# Altium footprint library AltiumDesignerLibraries.PcbLib: 313 footprints (part 15 of 20)
Each footprint in its own frame and in the unit in brackets; x right, y up, seen from the top. Pads: shape width x height; smd on the part's side, far side on the other; paste and mask are expansions set on the pad; w line width, h text height; cw(c..) or ccw(c..) is an arc to the next point about the centre after c.
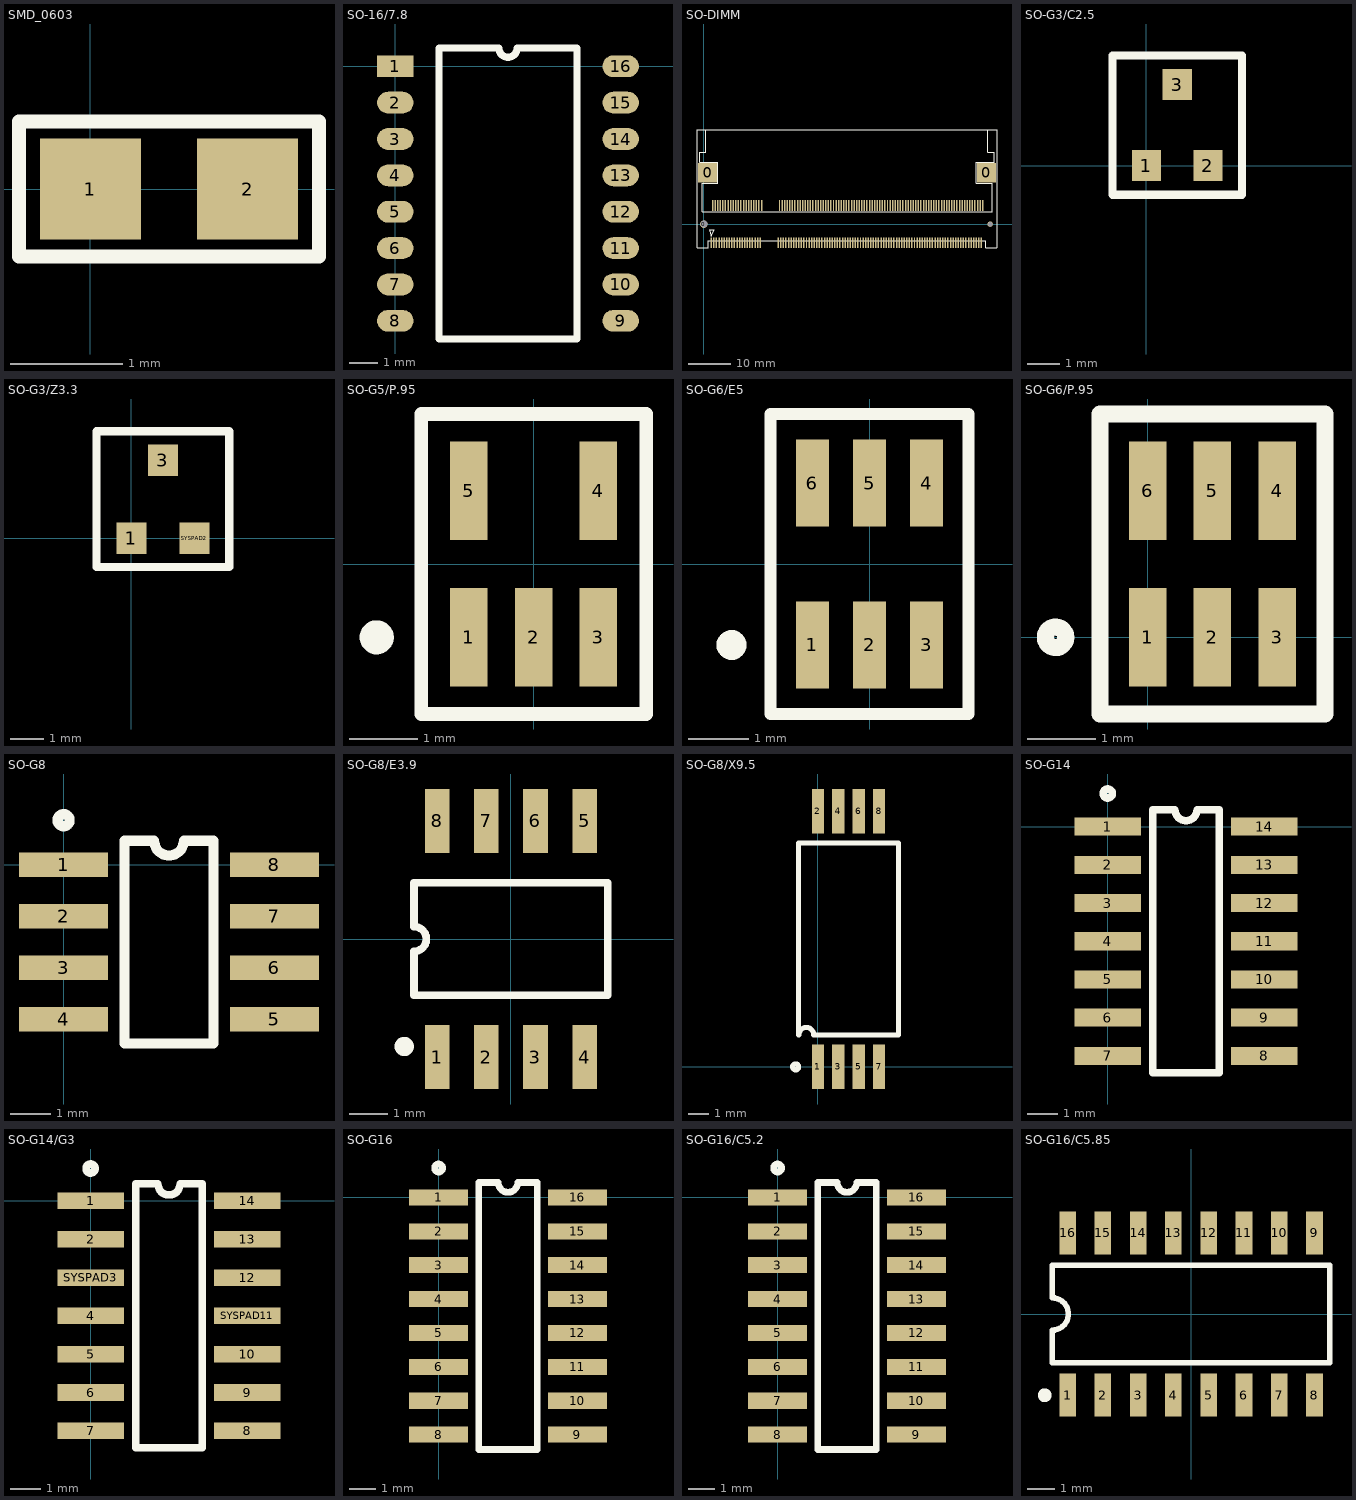
[diagram p14: the footprints below, top view; thin cyan lines are the x and y axes]

## SMD_0603 [mm]
pads (2):
  rect 0.9x0.9 smd: 1(0,0) 2(1.4,0)
Top Overlay:
  lines w0.127: -0.635,-0.6 -0.635,0.6 2.035,0.6 2.035,-0.6 -0.635,-0.6

## SO-16/7.8 [mil]
pads (16):
  rect 50x30 smd: 1(0,0)
  oval 50x30 smd: 2(0,-50) 3(0,-100) 4(0,-150) 5(0,-200) 6(0,-250) 7(0,-300) 8(0,-350) 9(310,-350) 10(310,-300) 11(310,-250) 12(310,-200) 13(310,-150) 14(310,-100) 15(310,-50) 16(310,0)
Top Overlay:
  lines w10: 60,-375 250,-375 250,25 167.5,25 cw(c155,25) 142.5,25 60,25 60,-375

## SO-DIMM [mm]
pads (204):
  round 1.75 hole 1.6 unplated: 0(0,0)
  rect 4.5x4.6 smd: 0(0.85,12) 0(65.95,12)
  round 1.25 hole 1.1 unplated: 0(66.8,0)
  rect 0.35x2.5 smd: 1(1.75,-4.35) 2(2.05,4.35) 3(2.35,-4.35) 4(2.65,4.35) 5(2.95,-4.35) 6(3.25,4.35) 7(3.55,-4.35) 8(3.85,4.35) 9(4.15,-4.35) 10(4.45,4.35) 11(4.75,-4.35) 12(5.05,4.35) 13(5.35,-4.35) 14(5.65,4.35) 15(5.95,-4.35) 16(6.25,4.35) 17(6.55,-4.35) 18(6.85,4.35) 19(7.15,-4.35) 20(7.45,4.35) 21(7.75,-4.35) 22(8.05,4.35) 23(8.35,-4.35) 24(8.65,4.35) 25(8.95,-4.35) 26(9.25,4.35) 27(9.55,-4.35) 28(9.85,4.35) 29(10.15,-4.35) 30(10.45,4.35) 31(10.75,-4.35) 32(11.05,4.35) 33(11.35,-4.35) 34(11.65,4.35) 35(11.95,-4.35) 36(12.25,4.35) 37(12.55,-4.35) 38(12.85,4.35) 39(13.15,-4.35) 40(13.45,4.35) 41(17.35,-4.35) 42(17.65,4.35) 43(17.95,-4.35) 44(18.25,4.35) 45(18.55,-4.35) 46(18.85,4.35) 47(19.15,-4.35) 48(19.45,4.35) 49(19.75,-4.35) 50(20.05,4.35) 51(20.35,-4.35) 52(20.65,4.35) 53(20.95,-4.35) 54(21.25,4.35) 55(21.55,-4.35) 56(21.85,4.35) 57(22.15,-4.35) 58(22.45,4.35) 59(22.75,-4.35) 60(23.05,4.35) 61(23.35,-4.35) 62(23.65,4.35) 63(23.95,-4.35) 64(24.25,4.35) 65(24.55,-4.35) 66(24.85,4.35) 67(25.15,-4.35) 68(25.45,4.35) 69(25.75,-4.35) 70(26.05,4.35) 71(26.35,-4.35) 72(26.65,4.35) 73(26.95,-4.35) 74(27.25,4.35) 75(27.55,-4.35) 76(27.85,4.35) 77(28.15,-4.35) 78(28.45,4.35) 79(28.75,-4.35) 80(29.05,4.35) 81(29.35,-4.35) 82(29.65,4.35) 83(29.95,-4.35) 84(30.25,4.35) 85(30.55,-4.35) 86(30.85,4.35) 87(31.15,-4.35) 88(31.45,4.35) 89(31.75,-4.35) 90(32.05,4.35) 91(32.35,-4.35) 92(32.65,4.35) 93(32.95,-4.35) 94(33.25,4.35) 95(33.55,-4.35) 96(33.85,4.35) 97(34.15,-4.35) 98(34.45,4.35) 99(34.75,-4.35) 100(35.05,4.35) 101(35.35,-4.35) 102(35.65,4.35) 103(35.95,-4.35) 104(36.25,4.35) 105(36.55,-4.35) 106(36.85,4.35) 107(37.15,-4.35) 108(37.45,4.35) 109(37.75,-4.35) 110(38.05,4.35) 111(38.35,-4.35) 112(38.65,4.35) 113(38.95,-4.35) 114(39.25,4.35) 115(39.55,-4.35) 116(39.85,4.35) 117(40.15,-4.35) 118(40.45,4.35) 119(40.75,-4.35) 120(41.05,4.35) 121(41.35,-4.35) 122(41.65,4.35) 123(41.95,-4.35) 124(42.25,4.35) 125(42.55,-4.35) 126(42.85,4.35) 127(43.15,-4.35) 128(43.45,4.35) 129(43.75,-4.35) 130(44.05,4.35) 131(44.35,-4.35) 132(44.65,4.35) 133(44.95,-4.35) 134(45.25,4.35) 135(45.55,-4.35) 136(45.85,4.35) 137(46.15,-4.35) 138(46.45,4.35) 139(46.75,-4.35) 140(47.05,4.35) 141(47.35,-4.35) 142(47.65,4.35) 143(47.95,-4.35) 144(48.25,4.35) 145(48.55,-4.35) 146(48.85,4.35) 147(49.15,-4.35) 148(49.45,4.35) 149(49.75,-4.35) 150(50.05,4.35) 151(50.35,-4.35) 152(50.65,4.35) 153(50.95,-4.35) 154(51.25,4.35) 155(51.55,-4.35) 156(51.85,4.35) 157(52.15,-4.35) 158(52.45,4.35) 159(52.75,-4.35) 160(53.05,4.35) 161(53.35,-4.35) 162(53.65,4.35) 163(53.95,-4.35) 164(54.25,4.35) 165(54.55,-4.35) 166(54.85,4.35) 167(55.15,-4.35) 168(55.45,4.35) 169(55.75,-4.35) 170(56.05,4.35) 171(56.35,-4.35) 172(56.65,4.35) 173(56.95,-4.35) 174(57.25,4.35) 175(57.55,-4.35) 176(57.85,4.35) 177(58.15,-4.35) 178(58.45,4.35) 179(58.75,-4.35) 180(59.05,4.35) 181(59.35,-4.35) 182(59.65,4.35) 183(59.95,-4.35) 184(60.25,4.35) 185(60.55,-4.35) 186(60.85,4.35) 187(61.15,-4.35) 188(61.45,4.35) 189(61.75,-4.35) 190(62.05,4.35) 191(62.35,-4.35) 192(62.65,4.35) 193(62.95,-4.35) 194(63.25,4.35) 195(63.55,-4.35) 196(63.85,4.35) 197(64.15,-4.35) 198(64.45,4.35) 199(64.75,-4.35) 200(65.05,4.35)
Top Overlay:
  lines w0.254: 0.5,22 0.5,16.775 -0.925,16.775 -0.925,15.175 -0.925,14.45 3.225,14.45 3.225,9.5 -0.325,9.5 -0.325,2.925 -0.3,2.95 1.975,2.95 65.075,2.95 ; 65.025,2.95 67.3,2.95 67.3,9.5 63.575,9.5 63.575,14.45 67.8,14.45 67.8,16.775 66.3,16.775 66.3,22 ; 1.75,-2.85 1.75,-2.85 ; 1.75,-2.85 2.4,-1.25 1.225,-1.25 1.75,-2.85 ; -1.6,-5.55 -1.6,22 68.4,22 68.4,-5.55 65.775,-5.55 65.775,-3.825 64.8,-3.825 1.7,-3.825 1.025,-3.825 1.025,-5.55 -1.6,-5.55

## SO-G3/C2.5 [mm]
pads (3):
  rect 0.9x0.95 smd: 1(0,0) 2(1.9,0) 3(0.95,2.5)
Top Overlay:
  lines w0.25: -1.05,-0.9 2.95,-0.9 2.95,3.4 -1.05,3.4 -1.05,-0.9

## SO-G3/Z3.3 [mm]
pads (3):
  rect 0.9x0.95 smd: 1(0,0) 3(0.95,2.35) SYSPAD2(1.9,0)
Top Overlay:
  lines w0.25: -1.05,-0.875 -1.05,3.225 2.95,3.225 2.95,-0.875 -1.05,-0.875

## SO-G5/P.95 [mm]
pads (5):
  rect 0.55x1.45 smd: 1(-0.95,-1.075) 2(0,-1.075) 3(0.95,-1.075) 4(0.95,1.075) 5(-0.95,1.075)
Top Overlay:
  circle w0.25: c-2.3,-1.075 r0.125
  lines w0.2: -1.65,-2.2 1.65,-2.2 1.65,2.2 -1.65,2.2 -1.65,-2.2

## SO-G6/E5 [mm]
pads (6):
  rect 0.55x1.45 smd: 1(-0.95,-1.35) 2(0,-1.35) 3(0.95,-1.35) 4(0.95,1.35) 5(0,1.35) 6(-0.95,1.35)
Top Overlay:
  circle w0.25: c-2.3,-1.35 r0.125
  lines w0.2: -1.65,-2.5 -1.65,2.5 1.65,2.5 1.65,-2.5 -1.65,-2.5

## SO-G6/P.95 [mm]
pads (6):
  rect 0.55x1.45 smd: 1(0,0) 2(0.95,0) 3(1.9,0) 4(1.9,2.15) 5(0.95,2.15) 6(0,2.15)
Top Overlay:
  circle w0.25: c-1.35,0 r0.15
  lines w0.25: -0.7,-1.125 -0.7,3.275 2.6,3.275 2.6,-1.125 -0.7,-1.125

## SO-G8 [mm] "SOIC 8 pin 0.5mm pitch"
pads (8):
  rect 2.2x0.6 smd: 1(0,0) 2(0,-1.27) 3(0,-2.54) 4(0,-3.81) 5(5.2,-3.81) 6(5.2,-2.54) 7(5.2,-1.27) 8(5.2,0)
Top Overlay:
  circle w0.25: c0,1.1 r0.15
  lines w0.25: 1.5,-4.405 3.7,-4.405 3.7,0.595 2.967,0.595 cw(c2.6,0.595) 2.233,0.595 1.5,0.595 1.5,-4.405

## SO-G8/E3.9 [mil] "SOIC 8 pin 0.5mm pitch wide body 6mm"
pads (8):
  rect 25x65 smd: 1(-75,-120) 2(-25,-120) 3(25,-120) 4(75,-120) 5(75,120) 6(25,120) 7(-25,120) 8(-75,120)
Top Overlay:
  circle w9.84: c-108.46,-109.25 r4.92
  lines w7.87: -98.43,-57.09 98.43,-57.09 98.43,57.09 -98.43,57.09 -98.43,12.5 cw(c-98.43,0) -98.43,-12.5 -98.43,-57.09

## SO-G8/X9.5 [mm] "SOIC 8 pin 0.5mm pitch extra wide body 12mm"
pads (8):
  rect 0.6x2.2 smd: 1(0,0) 2(0,12.7) 3(1.016,0) 4(1.016,12.7) 5(2.032,0) 6(2.032,12.7) 7(3.048,0) 8(3.048,12.7)
Top Overlay:
  circle w0.25: c-1.1,0 r0.15
  lines w0.25: -0.953,1.587 -0.953,11.112 4,11.112 4,1.587 -0.168,1.587 ; -0.938,1.587 cw(c-0.572,1.587) -0.205,1.587

## SO-G14 [mm] "SOIC 14 pin 0.5mm pitch standard body width"
pads (14):
  rect 2.2x0.6 smd: 1(0,0) 2(0,-1.27) 3(0,-2.54) 4(0,-3.81) 5(0,-5.08) 6(0,-6.35) 7(0,-7.62) 8(5.2,-7.62) 9(5.2,-6.35) 10(5.2,-5.08) 11(5.2,-3.81) 12(5.2,-2.54) 13(5.2,-1.27) 14(5.2,0)
Top Overlay:
  circle w0.25: c0,1.1 r0.15
  lines w0.25: 1.5,-8.185 3.7,-8.185 3.7,0.565 2.967,0.565 cw(c2.6,0.565) 2.233,0.565 1.5,0.565 1.5,-8.185

## SO-G14/G3 [mm]
pads (14):
  rect 2.2x0.55 smd: 1(0,0) 2(0,-1.27) 4(0,-3.81) 5(0,-5.08) 6(0,-6.35) 7(0,-7.62) 8(5.2,-7.62) 9(5.2,-6.35) 10(5.2,-5.08) 12(5.2,-2.54) 13(5.2,-1.27) 14(5.2,0) SYSPAD3(0,-2.54) SYSPAD11(5.2,-3.81)
Top Overlay:
  circle w0.25: c0,1.075 r0.15
  lines w0.25: 1.5,-8.185 3.7,-8.185 3.7,0.565 2.967,0.565 cw(c2.6,0.565) 2.233,0.565 1.5,0.565 1.5,-8.185

## SO-G16 [mm]
pads (16):
  rect 2.2x0.6 smd: 1(0,0) 2(0,-1.27) 3(0,-2.54) 4(0,-3.81) 5(0,-5.08) 6(0,-6.35) 7(0,-7.62) 8(0,-8.89) 9(5.2,-8.89) 10(5.2,-7.62) 11(5.2,-6.35) 12(5.2,-5.08) 13(5.2,-3.81) 14(5.2,-2.54) 15(5.2,-1.27) 16(5.2,0)
Top Overlay:
  circle w0.25: c0,1.1 r0.15
  lines w0.25: 1.5,-9.445 1.5,0.555 2.233,0.555 ccw(c2.6,0.555) 2.967,0.555 3.7,0.555 3.7,-9.445 1.5,-9.445

## SO-G16/C5.2 [mm] "SOIC 16 pin 5.2mm"
pads (16):
  rect 2.2x0.6 smd: 1(0,0) 2(0,-1.27) 3(0,-2.54) 4(0,-3.81) 5(0,-5.08) 6(0,-6.35) 7(0,-7.62) 8(0,-8.89) 9(5.2,-8.89) 10(5.2,-7.62) 11(5.2,-6.35) 12(5.2,-5.08) 13(5.2,-3.81) 14(5.2,-2.54) 15(5.2,-1.27) 16(5.2,0)
Top Overlay:
  circle w0.25: c0,1.1 r0.15
  lines w0.25: 1.5,-9.445 3.7,-9.445 3.7,0.555 2.967,0.555 cw(c2.6,0.555) 2.233,0.555 1.5,0.555 1.5,-9.445

## SO-G16/C5.85 [mm]
pads (16):
  rect 0.6x1.55 smd: 1(-4.445,-2.925) 2(-3.175,-2.925) 3(-1.905,-2.925) 4(-0.635,-2.925) 5(0.635,-2.925) 6(1.905,-2.925) 7(3.175,-2.925) 8(4.445,-2.925) 9(4.445,2.925) 10(3.175,2.925) 11(1.905,2.925) 12(0.635,2.925) 13(-0.635,2.925) 14(-1.905,2.925) 15(-3.175,2.925) 16(-4.445,2.925)
Top Overlay:
  circle w0.25: c-5.27,-2.925 r0.125
  lines w0.2: -5,-1.75 -5,-0.583 ccw(c-5,0) -5,0.583 -5,1.75 5,1.75 5,-1.75 -5,-1.75